# Altium footprint library PERCRO_footprints.PcbLib: 177 footprints (part 5 of 12)
Each footprint in its own frame and in the unit in brackets; x right, y up, seen from the top. Pads: shape width x height; smd on the part's side, far side on the other; paste and mask are expansions set on the pad; w line width, h text height; cw(c..) or ccw(c..) is an arc to the next point about the centre after c.
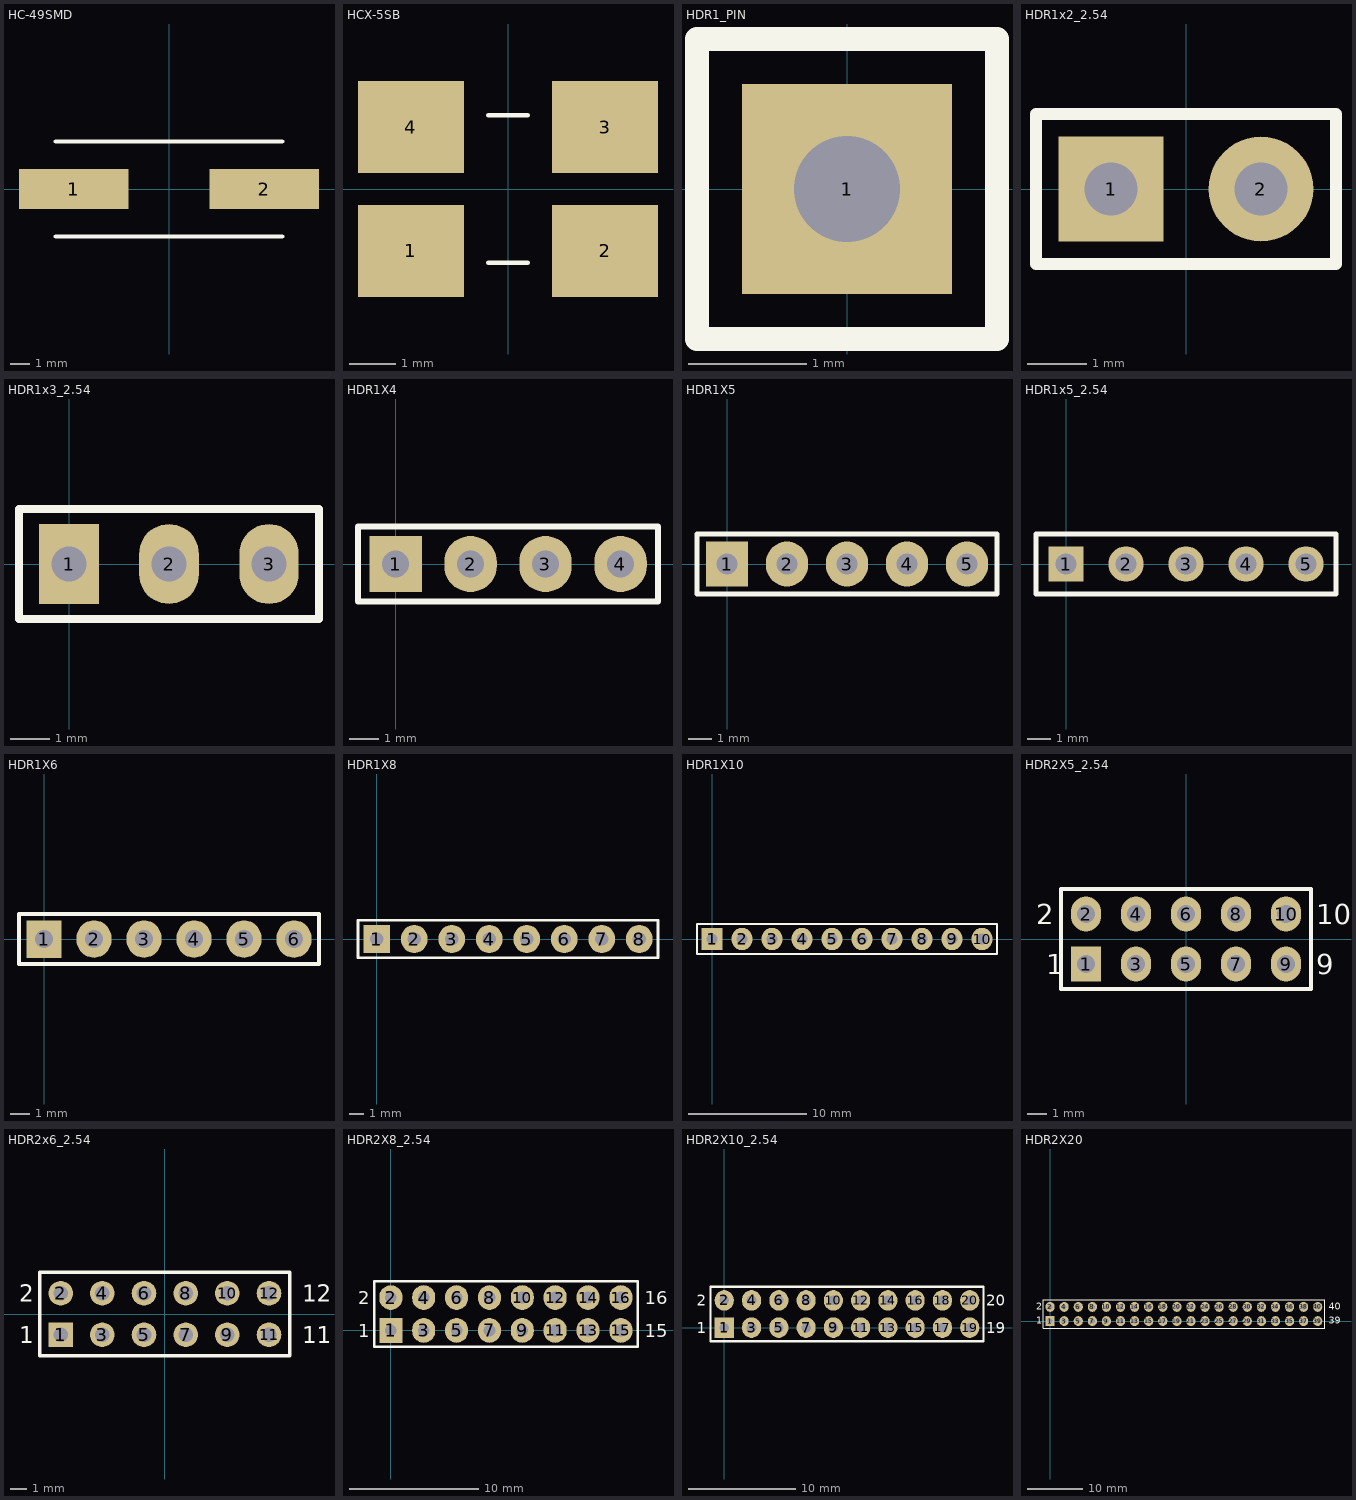
[diagram p4: the footprints below, top view; thin cyan lines are the x and y axes]

## HC-49SMD [mm] "XTAL SMD"
pads (2):
  rect 5.5x2 smd: 1(-4.8,0) 2(4.8,0)
Top Overlay:
  lines w0.203: -5.7,-2.4 5.7,-2.4 ; -5.7,2.4 5.7,2.4
3D body "Crystal_HC49_US-SM.step": height 4.3, standoff 0, extent -6.4,-2.415 6.4,2.415

## HCX-5SB [mil]
pads (4):
  rect 90.55x78.74 smd: 1(-83,-53) 2(83,-53) 3(83,53) 4(-83,53)
Top Overlay:
  lines w3.94: -17.01,-63 17,-63 ; -17.01,62.99 17.01,62.99
3D body: height 39.37, standoff 0, extent -98.43,-62.99 98.43,62.99

## HDR1_PIN [mil] "Header, 1-Pin"
pads (1):
  rect 70x70 hole 35.43: 1(0,0)
Top Overlay:
  lines w7.87: -50,-50 -50,50 50,50 50,-50 -50,-50

## HDR1x2_2.54 [mil] "Header, 2-Pin, 2.54mm Pitch"
pads (2):
  rect 70x70 hole 35.43: 1(-50,0)
  round 70 hole 35.43: 2(50,0)
Top Overlay:
  lines w7.87: -100,-50 -100,50 100,50 100,-50 -100,-50
3D body "Header1x2.STEP": height 332.28, standoff -100, extent -100,-50 100,50

## HDR1x3_2.54 [mil] "Header, 3-Pin, 2.54mm Pitch"
pads (3):
  rect 60x80 hole 35.43: 1(0,0)
  oval 60x80 hole 35.43: 2(100,0)
  oval 59.06x80 hole 35.43: 3(200,0)
Top Overlay:
  lines w7.87: -50,-55 250,-55 250,55 -50,55 -50,-55

## HDR1X4 [mil] "Connector; Header; 4 Position"
pads (4):
  rect 70x75 hole 35.43: 1(0,0)
  oval 70x75 hole 35.43: 2(100,0) 3(200,0) 4(300,0)
Top Overlay:
  lines w7.87: -50,-50 -50,50 350,50 350,-50 -50,-50

## HDR1X5 [mil] "Connector; Header; 5 Position"
pads (5):
  rect 70x75 hole 35.43: 1(0,0)
  oval 70x75 hole 35.43: 2(100,0) 3(200,0) 4(300,0) 5(400,0)
Top Overlay:
  lines w7.87: -50,-50 -50,50 450,50 450,-50 -50,-50

## HDR1x5_2.54 [mm] "Header, 5-Pin, 2.54mm Pitch"
pads (5):
  rect 1.5x1.5 hole 0.9: 1(0,0)
  round 1.5 hole 0.9: 2(2.54,0) 3(5.08,0) 4(7.62,0) 5(10.16,0)
Top Overlay:
  lines w0.2: -1.27,-1.27 11.43,-1.27 11.43,1.27 -1.27,1.27 -1.27,-1.27
3D body "HEADER 1x5.step": height 8.51, standoff -3.68, extent -1.27,-1.4 11.43,1.52

## HDR1X6 [mil] "Connector; Header; 6 Position"
pads (6):
  rect 70x75 hole 35.43: 1(0,0)
  oval 70x75 hole 35.43: 2(100,0) 3(200,0) 4(300,0) 5(400,0) 6(500,0)
Top Overlay:
  lines w7.87: -50,-50 -50,50 550,50 550,-50 -50,-50

## HDR1X8 [mil] "Connector; Header; 8 Position"
pads (8):
  rect 70x75 hole 35.43: 1(0,0)
  oval 70x75 hole 35.43: 2(100,0) 3(200,0) 4(300,0) 5(400,0) 6(500,0) 7(600,0) 8(700,0)
Top Overlay:
  lines w7.87: -50,-50 -50,50 750,50 750,-50 -50,-50

## HDR1X10 [mil] "Connector; Header; 10 Position"
pads (10):
  rect 70x75 hole 35.43: 1(0,0)
  oval 70x75 hole 35.43: 2(100,0) 3(200,0) 4(300,0) 5(400,0) 6(500,0) 7(600,0) 8(700,0) 9(800,0) 10(900,0)
Top Overlay:
  lines w7.87: -50,-50 950,-50 950,50 25,50 -50,50 -50,-50

## HDR2X5_2.54 [mil]
pads (10):
  rect 60x70 hole 35.43: 1(-200,-50)
  oval 60x70 hole 35.43: 2(-200,50) 3(-100,-50) 4(-100,50) 5(0,-50) 6(0,50) 7(100,-50) 8(100,50) 9(200,-50) 10(200,50)
Top Overlay:
  lines w7.87: -250,-100 -250,100 250,100 250,-100 -250,-100
  text "2" at -300,30 h40
  text "1" at -280,-70 h40
  text "9" at 260,-70 h40
  text "10" at 260,30 h40

## HDR2x6_2.54 [mm] "Header, 6-Pin, Dual row 2.54mm Pitch"
pads (12):
  rect 1.5x1.5 hole 0.9: 1(-6.35,-1.27)
  round 1.5 hole 0.9: 2(-6.35,1.27) 3(-3.81,-1.27) 4(-3.81,1.27) 5(-1.27,-1.27) 6(-1.27,1.27) 7(1.27,-1.27) 8(1.27,1.27) 9(3.81,-1.27) 10(3.81,1.27) 11(6.35,-1.27) 12(6.35,1.27)
Top Overlay:
  lines w0.2: -7.62,-2.54 -7.62,2.54 7.62,2.54 7.62,-2.54 -7.62,-2.54
  text "1" at -8.89,-1.778 h1.02
  text "2" at -8.89,0.762 h1.02
  text "11" at 8.382,-1.778 h1.02
  text "12" at 8.382,0.762 h1.02

## HDR2X8_2.54 [mil] "Connector; Header; 10x2 Position"
pads (16):
  rect 70x75 hole 35.43: 1(0,0)
  oval 70x75 hole 35.43: 2(0,100) 3(100,0) 4(100,100) 5(200,0) 6(200,100) 7(300,0) 8(300,100) 9(400,0) 10(400,100) 11(500,0) 12(500,100) 13(600,0) 14(600,100) 15(700,0) 16(700,100)
Top Overlay:
  lines w7.87: -50,-50 25,-50 751,-50 751,150 25,150 -50,150 -50,-50
  text "16" at 773,80 h40
  text "15" at 773,-20 h40
  text "1" at -100,-20 h40
  text "2" at -100,80 h40

## HDR2X10_2.54 [mil] "Connector; Header; 10x2 Position"
pads (20):
  rect 70x75 hole 35.43: 1(0,0)
  oval 70x75 hole 35.43: 2(0,100) 3(100,0) 4(100,100) 5(200,0) 6(200,100) 7(300,0) 8(300,100) 9(400,0) 10(400,100) 11(500,0) 12(500,100) 13(600,0) 14(600,100) 15(700,0) 16(700,100) 17(800,0) 18(800,100) 19(900,0) 20(900,100)
Top Overlay:
  lines w7.87: -50,-50 25,-50 950,-50 950,150 25,150 -50,150 -50,-50
  text "20" at 960,80 h40
  text "19" at 960,-20 h40
  text "1" at -100,-20 h40
  text "2" at -100,80 h40
3D body "female_header_a-bl254-dg-g20d.stp": height 334.65, standoff -125.98, extent -54.92,-48.42 954.93,148.43

## HDR2X20 [mil] "Connector; Header; 20x2 Position"
pads (40):
  rect 65x70 hole 35.43: 1(0,0)
  oval 65x70 hole 35.43: 2(0,100) 3(100,0) 4(100,100) 5(200,0) 6(200,100) 7(300,0) 8(300,100) 9(400,0) 10(400,100) 11(500,0) 12(500,100) 13(600,0) 14(600,100) 15(700,0) 16(700,100) 17(800,0) 18(800,100) 19(900,0) 20(900,100) 21(1000,0) 22(1000,100) 23(1100,0) 24(1100,100) 25(1200,0) 26(1200,100) 27(1300,0) 28(1300,100) 29(1400,0) 30(1400,100) 31(1500,0) 32(1500,100) 33(1600,0) 34(1600,100) 35(1700,0) 36(1700,100) 37(1800,0) 38(1800,100) 39(1900,0) 40(1900,100)
Top Overlay:
  lines w7.87: -50,-50 1950,-50 1950,150 -50,150 -50,-50
  text "1" at -100,-20 h50
  text "2" at -100,80 h50
  text "40" at 1980,80 h50
  text "39" at 1980,-20 h50
3D body "Female_Header_2x20.step": height 40.36, standoff -396.65, extent -53.93,-50.78 1957.88,146.07